# Altium footprint library S7CAS_LIB2023.PcbLib: 121 footprints (part 4 of 8)
Each footprint in its own frame and in the unit in brackets; x right, y up, seen from the top. Pads: shape width x height; smd on the part's side, far side on the other; paste and mask are expansions set on the pad; w line width, h text height; cw(c..) or ccw(c..) is an arc to the next point about the centre after c.
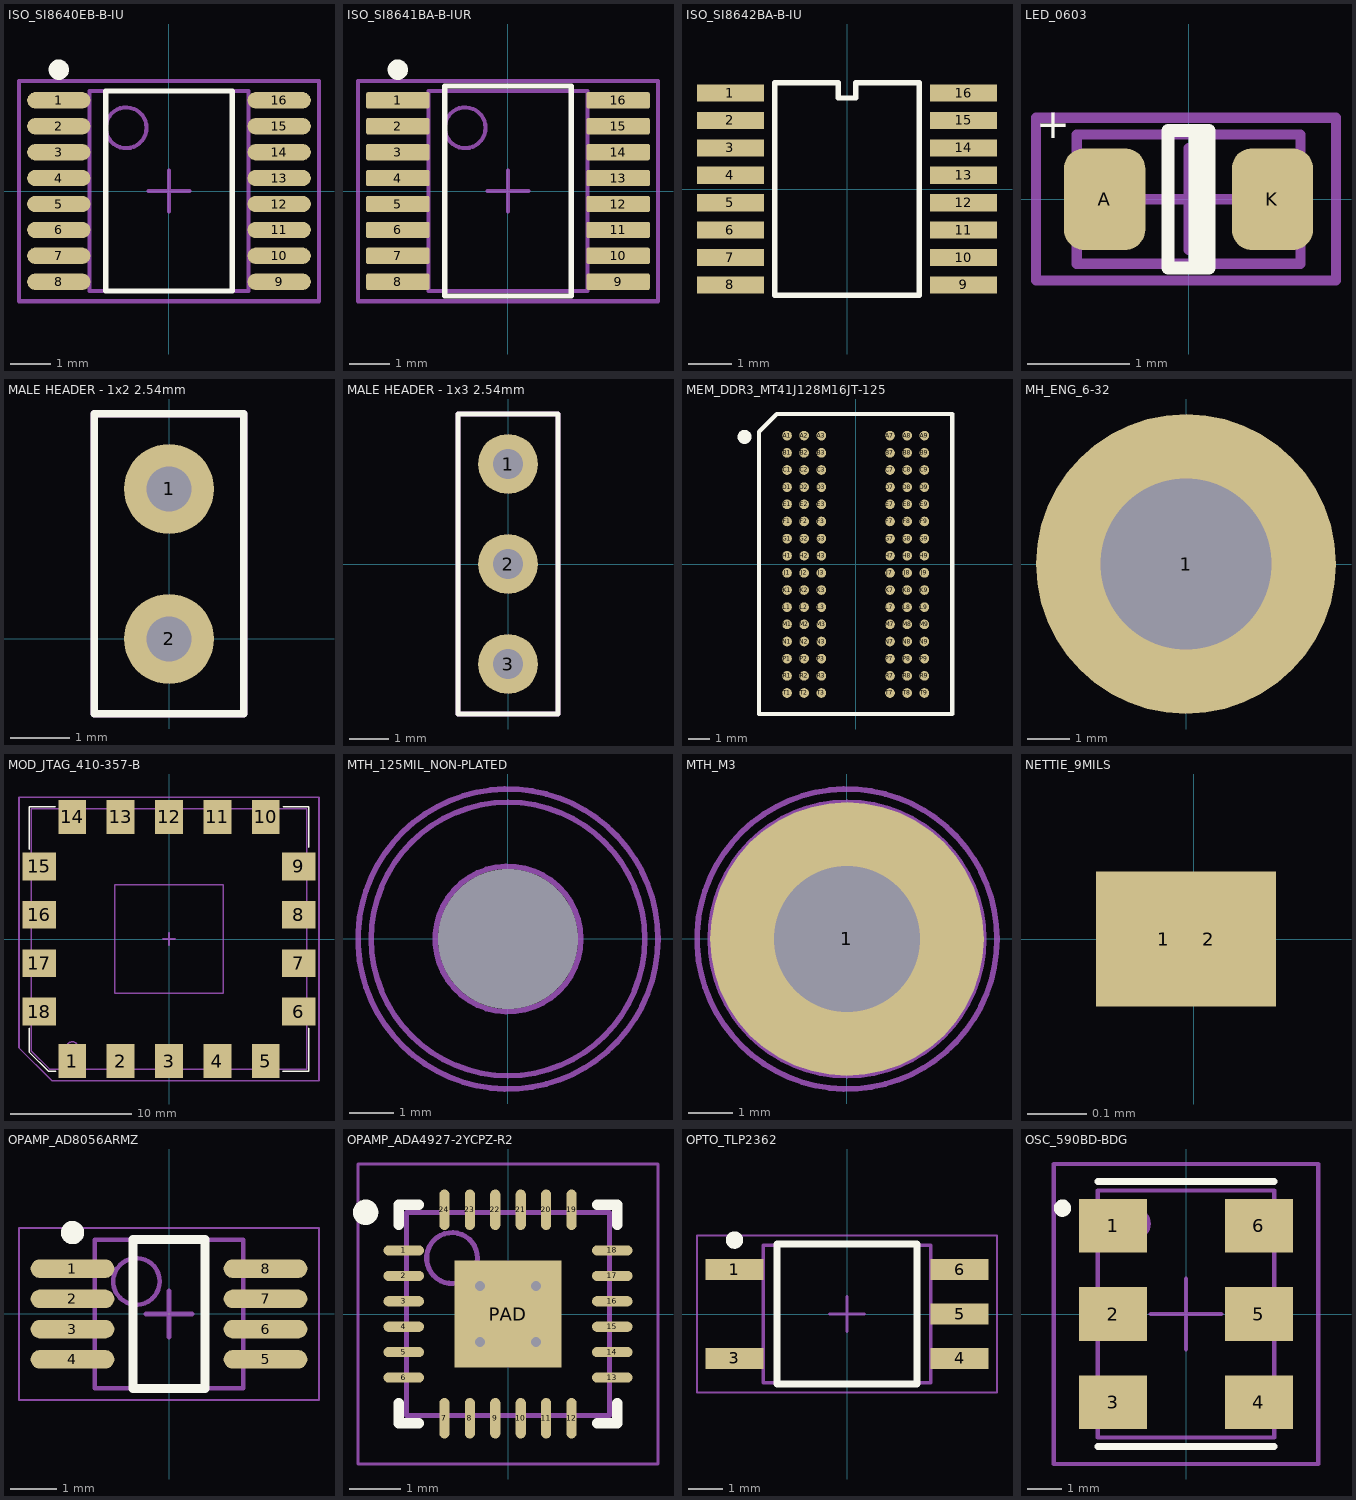
[diagram p3: the footprints below, top view; thin cyan lines are the x and y axes]

## ISO_SI8640EB-B-IU [mm]
pads (16):
  oval 1.55x0.4 smd paste-0.025 mask+0.05: 1(-2.7,2.222) 2(-2.7,1.587) 3(-2.7,0.953) 4(-2.7,0.318) 5(-2.7,-0.318) 6(-2.7,-0.953) 7(-2.7,-1.587) 8(-2.7,-2.222) 9(2.7,-2.222) 10(2.7,-1.587) 11(2.7,-0.953) 12(2.7,-0.318) 13(2.7,0.318) 14(2.7,0.953) 15(2.7,1.587) 16(2.7,2.222)
Top Overlay:
  circle w0.25: c-2.7,2.973 r0.125
  lines w0.127: -1.55,-2.45 1.55,-2.45 1.55,2.45 -1.55,2.45 -1.55,-2.45
Top Assembly:
  circle w0.1: c-1.05,1.55 r0.5
  lines w0.1: -1.95,-2.45 1.95,-2.45 1.95,2.45 -1.95,2.45 -1.95,-2.45
Mechanical 15:
  lines w0.1: -0.5,0 0.5,0 ; 0,-0.5 0,0.5 ; -3.675,-2.7 3.675,-2.7 3.675,2.7 -3.675,2.7 -3.675,-2.7
3D body "SOP64P600X175-16N.step": height 1.75, standoff 0, extent -3,-2.45 3,2.45

## ISO_SI8641BA-B-IUR [mm]
pads (16):
  rrect20% 1.55x0.4 smd paste-0.025 mask+0.05: 1(-2.7,2.222) 2(-2.7,1.587) 3(-2.7,0.953) 4(-2.7,0.318) 5(-2.7,-0.318) 6(-2.7,-0.953) 7(-2.7,-1.587) 8(-2.7,-2.222) 9(2.7,-2.222) 10(2.7,-1.587) 11(2.7,-0.953) 12(2.7,-0.318) 13(2.7,0.318) 14(2.7,0.953) 15(2.7,1.587) 16(2.7,2.222)
Top Overlay:
  circle w0.25: c-2.7,2.973 r0.125
  lines w0.127: -1.55,-2.575 -1.55,2.575 1.55,2.575 1.55,-2.575 -1.55,-2.575
Top Assembly:
  circle w0.1: c-1.05,1.55 r0.5
  lines w0.1: -1.95,-2.45 -1.95,2.45 1.95,2.45 1.95,-2.45 -1.95,-2.45
Mechanical 15:
  lines w0.1: -0.5,0 0.5,0 ; 0,-0.5 0,0.5 ; -3.675,-2.7 -3.675,2.7 3.675,2.7 3.675,-2.7 -3.675,-2.7
3D body "SOP64P600X175-16N.step": height 1.75, standoff 0, extent -3,-2.45 3,2.45

## ISO_SI8642BA-B-IU [mm]
pads (16):
  rect 1.55x0.4 smd: 1(-2.7,2.222) 2(-2.7,1.587) 3(-2.7,0.953) 4(-2.7,0.318) 5(-2.7,-0.318) 6(-2.7,-0.953) 7(-2.7,-1.587) 8(-2.7,-2.222) 9(2.7,-2.222) 10(2.7,-1.587) 11(2.7,-0.953) 12(2.7,-0.318) 13(2.7,0.318) 14(2.7,0.953) 15(2.7,1.587) 16(2.7,2.222)
Top Overlay:
  lines w0.127: -1.676,-2.46 1.676,-2.46 1.676,2.46 0.2,2.46 0.2,2.108 -0.2,2.108 -0.2,2.46 -1.676,2.46 -1.676,-2.46
3D body "User Library-TSSOP-16-1.step": height 1.1, standoff 0, extent -3.2,-2.5 3.2,2.5

## LED_0603 [mm] "Light Emitting Diode - Package 1608"
height 1.4
pads (2):
  rrect50% 0.8x1 smd: A(-0.825,0) K(0.825,0)
Top Overlay:
  rectangle: 0,-0.675 0.15,0.675
  lines w0.127: -0.2,-0.675 -0.2,0.675 0.2,0.675 0.2,-0.675 -0.2,-0.675
  text "+" at -1.5,0.5 h0.5
Mechanical 13:
  lines w0.1: -1.1,-0.635 1.1,-0.635 1.1,0.635 -1.1,0.635 -1.1,-0.635
Mechanical 15:
  lines w0.1: -0.5,0 0.5,0 ; 0,-0.5 0,0.5 ; -1.5,-0.8 1.45,-0.8 1.45,0.8 -1.5,0.8 -1.5,-0.8
3D body "User Library-led0603_RED.STEP": height 1.1, standoff 0, extent -0.81,-0.381 0.81,0.419

## MALE HEADER - 1x2 2.54mm [mil] "MALE HEADER - 1x2 2.54mm"
pads (2):
  round 60 hole 30 mask+3: 1(0,100) 2(0,0)
Top Overlay:
  lines w5: -50,-50 -50,150 50,150 50,-50 -50,-50
  text ".Designator" at 90,-140 h30
Top Designator:
  text ".Designator" at 0,-100 h30
Mechanical 15:
  lines w5: -50,-50 50,-50 50,150 -50,150 -50,-50
3D body "61300211121_Download_STP_61300211121_rev1.stp": height 336.22, standoff -118.11, extent -50,-50 50,150

## MALE HEADER - 1x3 2.54mm [mil] "MALE HEADER - 1x3 2.54mm"
pads (3):
  round 60 hole 30 mask+3: 1(0,100) 2(0,0) 3(0,-100)
Top Overlay:
  lines w5: -50,-150 -50,150 50,150 50,-150 -50,-150
  text ".Designator" at 90,-140 h30
Top Designator:
  text ".Designator" at 0,-100 h30
Mechanical 15:
  lines w5: -50,-150 50,-150 50,150 -50,150 -50,-150
3D body "61300311121_Download_STP_61300311121_rev1.stp": height 336.22, standoff -118.11, extent -50,-150 50,150

## MEM_DDR3_MT41J128M16JT-125 [mm]
height 1
pads (96):
  round 0.45 smd: A1(-3.2,6) A2(-2.4,6) A3(-1.6,6) A7(1.6,6) A8(2.4,6) A9(3.2,6) B1(-3.2,5.2) B2(-2.4,5.2) B3(-1.6,5.2) B7(1.6,5.2) B8(2.4,5.2) B9(3.2,5.2) C1(-3.2,4.4) C2(-2.4,4.4) C3(-1.6,4.4) C7(1.6,4.4) C8(2.4,4.4) C9(3.2,4.4) D1(-3.2,3.6) D2(-2.4,3.6) D3(-1.6,3.6) D7(1.6,3.6) D8(2.4,3.6) D9(3.2,3.6) E1(-3.2,2.8) E2(-2.4,2.8) E3(-1.6,2.8) E7(1.6,2.8) E8(2.4,2.8) E9(3.2,2.8) F1(-3.2,2) F2(-2.4,2) F3(-1.6,2) F7(1.6,2) F8(2.4,2) F9(3.2,2) G1(-3.2,1.2) G2(-2.4,1.2) G3(-1.6,1.2) G7(1.6,1.2) G8(2.4,1.2) G9(3.2,1.2) H1(-3.2,0.4) H2(-2.4,0.4) H3(-1.6,0.4) H7(1.6,0.4) H8(2.4,0.4) H9(3.2,0.4) J1(-3.2,-0.4) J2(-2.4,-0.4) J3(-1.6,-0.4) J7(1.6,-0.4) J8(2.4,-0.4) J9(3.2,-0.4) K1(-3.2,-1.2) K2(-2.4,-1.2) K3(-1.6,-1.2) K7(1.6,-1.2) K8(2.4,-1.2) K9(3.2,-1.2) L1(-3.2,-2) L2(-2.4,-2) L3(-1.6,-2) L7(1.6,-2) L8(2.4,-2) L9(3.2,-2) M1(-3.2,-2.8) M2(-2.4,-2.8) M3(-1.6,-2.8) M7(1.6,-2.8) M8(2.4,-2.8) M9(3.2,-2.8) N1(-3.2,-3.6) N2(-2.4,-3.6) N3(-1.6,-3.6) N7(1.6,-3.6) N8(2.4,-3.6) N9(3.2,-3.6) P1(-3.2,-4.4) P2(-2.4,-4.4) P3(-1.6,-4.4) P7(1.6,-4.4) P8(2.4,-4.4) P9(3.2,-4.4) R1(-3.2,-5.2) R2(-2.4,-5.2) R3(-1.6,-5.2) R7(1.6,-5.2) R8(2.4,-5.2) R9(3.2,-5.2) T1(-3.2,-6) T2(-2.4,-6) T3(-1.6,-6) T7(1.6,-6) T8(2.4,-6) T9(3.2,-6)
Top Overlay:
  circle w0.4: c-5.182,5.944 r0.127
  lines w0.2: -4.51,-6.98 4.5,-6.98 4.5,7.01 -3.683,7.01 -4.51,6.183 -4.51,-6.98
3D body "FBGA-96 (14X9).STEP": height 1.05, standoff -0.05, extent -4.5,-7 4.5,7

## MH_ENG_6-32 [mm] "Mounting hole - Imperial 6-32"
pads (1):
  round 7 hole 4: 1(0,0)

## MOD_JTAG_410-357-B [mm]
pads (18):
  rect 2.3x2.8 smd paste-0.025 mask+0.07: 1(-8,-10.1) 2(-4,-10.1) 3(0,-10.1) 4(4,-10.1) 5(8,-10.1) 10(8,10.1) 11(4,10.1) 12(0,10.1) 13(-4,10.1) 14(-8,10.1)
  rect 2.8x2.3 smd paste-0.025 mask+0.07: 6(10.725,-6) 7(10.725,-2) 8(10.725,2) 9(10.725,6) 15(-10.725,6) 16(-10.725,2) 17(-10.725,-2) 18(-10.725,-6)
Top Overlay:
  lines w0.127: -11.57,-7.39 -11.57,-9.339 -9.969,-10.94 -9.37,-10.94 ; -11.57,7.43 -11.57,10.94 -9.41,10.94 ; 9.39,-10.94 11.57,-10.94 11.57,-7.39 ; 9.45,10.94 11.57,10.94 11.57,7.59
Top Assembly:
  circle w0.127: c-8,-9 r0.5
  lines w0.127: -11.38,-9.25 -9.88,-10.75 11.38,-10.75 11.38,10.75 -11.38,10.75 -11.38,-9.25 ; -4.5,-4.5 -4.5,4.5 4.5,4.5 4.5,-4.5 -4.5,-4.5
Mechanical 15:
  lines w0.127: -0.5,0 0.5,0 ; 0,-0.5 0,0.5 ; -12.4,-9 -9.7,-11.7 12.4,-11.7 12.4,11.7 -12.4,11.7 -12.4,-9
3D body: height 1.5, standoff 0, extent -11.38,-10.75 11.38,10.75
3D body: height 2.5, standoff 1.5, extent -4.5,-4.5 4.5,4.5

## MTH_125MIL_NON-PLATED [mm]
pads (1):
  round 0 hole 3.175 unplated paste-2539.97 mask+0.102: 0(0,0)
Top Assembly:
  circle w0.127: c0,0 r3.1
  circle w0.127: c0,0 r1.65
Bottom Assembly:
  circle w0.127: c0,0 r3.1
  circle w0.127: c0,0 r1.65
Mechanical 15:
  circle w0.127: c0,0 r3.4
  lines w0.127: -0.508,0 0.508,0 ; 0,-0.508 0,0.508
Mechanical 16:
  circle w0.127: c0,0 r3.4
  lines w0.127: -0.508,0 0.508,0 ; 0,-0.508 0,0.508

## MTH_M3 [mm]
pads (1):
  round 6.2 hole 3.3 paste-2539.97 mask+0.07: 1(0,0)
Top Assembly:
  circle w0.127: c0,0 r3.1
  circle w0.127: c0,0 r1.65
Bottom Assembly:
  circle w0.127: c0,0 r3.1
  circle w0.127: c0,0 r1.65
Mechanical 15:
  circle w0.127: c0,0 r3.4
  lines w0.127: -0.508,0 0.508,0 ; 0,-0.508 0,0.508
Mechanical 16:
  circle w0.127: c0,0 r3.4
  lines w0.127: -0.508,0 0.508,0 ; 0,-0.508 0,0.508

## NETTIE_9MILS [mil]
pads (2):
  rect 9x9 smd paste-99999 mask+2.76: 1(-2,0) 2(1,0)

## OPAMP_AD8056ARMZ [mm] "SOP, 8-Leads, Body 3x3mm, Pitch 0.65mm, IPC Medium Density"
height 1.1
pads (8):
  oval 1.8x0.4 smd mask+0.07: 1(-2.075,0.975) 2(-2.075,0.325) 3(-2.075,-0.325) 4(-2.075,-0.975) 5(2.075,-0.975) 6(2.075,-0.325) 7(2.075,0.325) 8(2.075,0.975)
Top Overlay:
  circle w0.25: c-2.075,1.75 r0.125
  lines w0.2: -0.775,-1.6 -0.775,1.6 0.775,1.6 0.775,-1.6 -0.775,-1.6
Mechanical 13:
  circle w0.1: c-0.7,0.7 r0.5
  lines w0.1: -1.6,-1.6 -1.6,1.6 1.6,1.6 1.6,-1.6 -1.6,-1.6
Mechanical 15:
  lines w0.05: -3.225,-1.85 -3.225,1.85 3.225,1.85 3.225,-1.85 -3.225,-1.85
  lines w0.1: -0.5,0 0.5,0 ; 0,-0.5 0,0.5
3D body "User Library-DCT-8.STEP": height 1.3, standoff 0, extent -2.125,-1.525 2.075,1.525

## OPAMP_ADA4927-2YCPZ-R2 [mm] "QFN, 24-Leads, Body 4,00x4,00mm, Pitch 0,50mm, Thermal Pad 2,10x2,10mm, IPC Low Density"
height 1
pads (25):
  oval 0.8x0.2 smd mask+0.075: 1(-2.05,1.25) 2(-2.05,0.75) 3(-2.05,0.25) 4(-2.05,-0.25) 5(-2.05,-0.75) 6(-2.05,-1.25) 13(2.05,-1.25) 14(2.05,-0.75) 15(2.05,-0.25) 16(2.05,0.25) 17(2.05,0.75) 18(2.05,1.25)
  oval 0.2x0.8 smd mask+0.075: 7(-1.25,-2.05) 8(-0.75,-2.05) 9(-0.25,-2.05) 10(0.25,-2.05) 11(0.75,-2.05) 12(1.25,-2.05) 19(1.25,2.05) 20(0.75,2.05) 21(0.25,2.05) 22(-0.25,2.05) 23(-0.75,2.05) 24(-1.25,2.05)
  rect 2.1x2.1 smd mask+0.075: PAD(0,0)
via 0.55,-0.55 diameter 0.5 hole 0.2
via -0.55,-0.55 diameter 0.5 hole 0.2
via 0.55,0.55 diameter 0.5 hole 0.2
via -0.55,0.55 diameter 0.5 hole 0.2
Top Overlay:
  circle w0.25: c-2.8,2 r0.125
  lines w0.2: -2.15,-1.75 -2.15,-2.15 -1.75,-2.15 ; -2.15,1.75 -2.15,2.15 -1.75,2.15 ; 1.75,-2.15 2.15,-2.15 2.15,-1.75 ; 1.75,2.15 2.15,2.15 2.15,1.75
Mechanical 13:
  circle w0.1: c-1.1,1.1 r0.5
  lines w0.1: -2,-2 2,-2 2,2 -2,2 -2,-2
Mechanical 15:
  lines w0.05: -2.95,-2.95 2.95,-2.95 2.95,2.95 -2.95,2.95 -2.95,-2.95
  lines w0.1: -0.5,0 0.5,0 ; 0,-0.5 0,0.5
3D body: height 1, standoff 0.02, extent -2,-2 2,2

## OPTO_TLP2362 [mm] "SOT23, 5-Leads, Body 3.75x7.00mm, Pitch 1.27mm, IPC Medium Density"
height 2.2
pads (5):
  rect 1.65x0.6 smd: 1(-3.225,1.27) 3(-3.225,-1.27) 4(3.225,-1.27) 5(3.225,0) 6(3.225,1.27)
Top Overlay:
  circle w0.25: c-3.225,2.12 r0.125
  lines w0.2: -2,-2 2,-2 2,2 -2,2 -2,-2
  text ".Designator" at -2.971,3.048 h0.76
Top Assembly:
  lines w0.1: -2.4,-1.975 -2.4,1.975 2.4,1.975 2.4,-1.975 -2.4,-1.975
Top Designator:
  text ".Designator" at 0.254,0.508 h0.76
Top Courtyard:
  lines w0.05: -4.3,-2.25 -4.3,2.25 4.3,2.25 4.3,-2.25 -4.3,-2.25
  lines w0.1: -0.5,0 0.5,0 ; 0,-0.5 0,0.5
3D body "TLP2362_TPR_E.step": height 2.3, standoff 0, extent -3.5,-1.85 3.5,1.85

## OSC_590BD-BDG [mm]
pads (6):
  rect 1.95x1.55 smd paste-0.025 mask+0.07: 1(-2.1,2.54) 2(-2.1,0) 3(-2.1,-2.54) 4(2.1,-2.54) 5(2.1,0) 6(2.1,2.54)
Top Overlay:
  circle w0.25: c-3.556,3.048 r0.125
  lines w0.2: -2.54,-3.81 -1.346,-3.81 2.54,-3.81 ; -2.54,3.81 -1.346,3.81 2.54,3.81
Top Assembly:
  circle w0.127: c-1.5,2.6 r0.424
  lines w0.127: -2.54,-3.556 -2.54,3.556 2.54,3.556 2.54,-3.556 -2.54,-3.556
Mechanical 15:
  lines w0.127: -1.016,0 1.016,0 ; 0,-1.016 0,1.016 ; -3.81,-4.318 -3.81,4.318 3.81,4.318 3.81,-4.318 -3.81,-4.318
3D body: height 1.28, standoff 0, extent -2.54,-3.556 2.54,3.556
3D body: height 1.3, standoff 0, extent -1.921,2.141 -1.124,2.939